# Altium footprint library Tienanh.PcbLib: 190 footprints (part 11 of 12)
Each footprint in its own frame and in the unit in brackets; x right, y up, seen from the top. Pads: shape width x height; smd on the part's side, far side on the other; paste and mask are expansions set on the pad; w line width, h text height; cw(c..) or ccw(c..) is an arc to the next point about the centre after c.
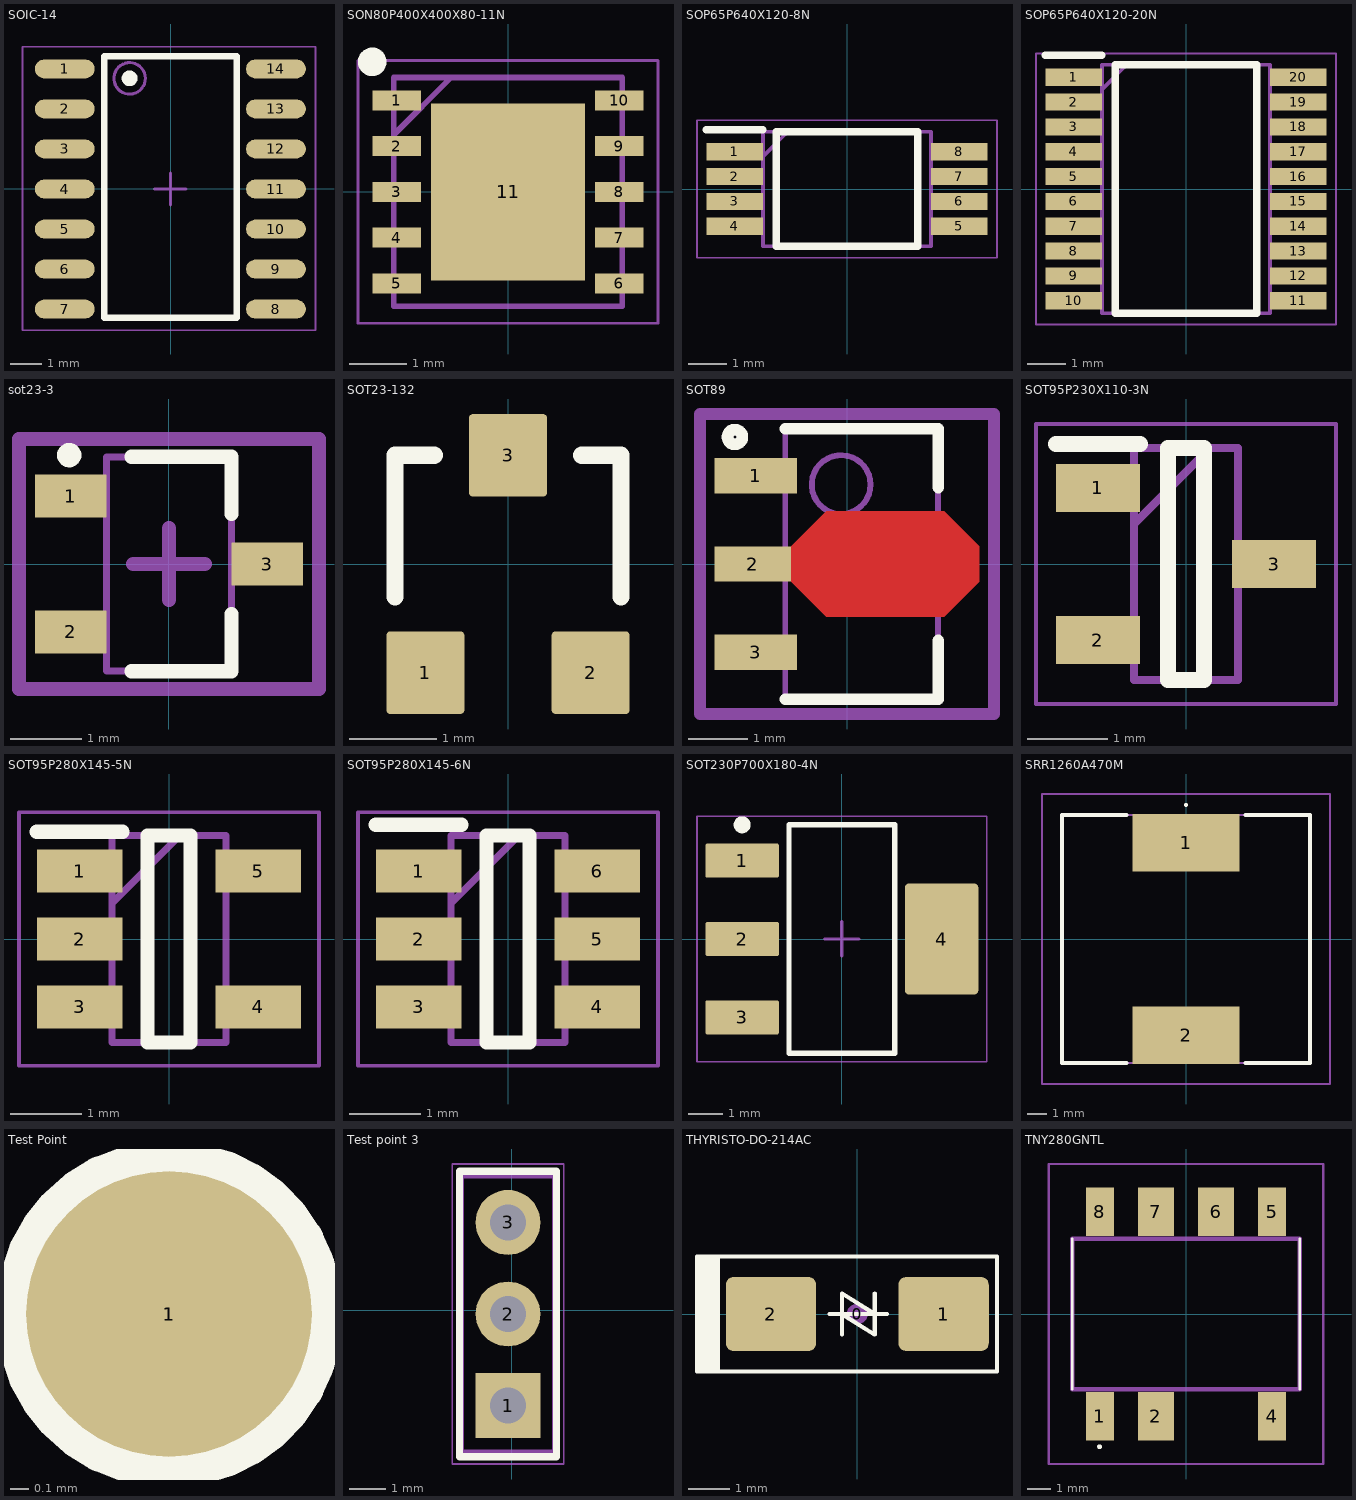
[diagram p10: the footprints below, top view; thin cyan lines are the x and y axes]

## SOIC-14 [mm]
pads (14):
  oval 1.9x0.6 smd mask+0.07: 1(-3.357,3.799) 2(-3.357,2.529) 3(-3.357,1.259) 4(-3.357,-0.011) 5(-3.357,-1.281) 6(-3.357,-2.551) 7(-3.357,-3.821) 8(3.343,-3.821) 9(3.343,-2.551) 10(3.343,-1.281) 11(3.343,-0.011) 12(3.343,1.259) 13(3.343,2.529) 14(3.343,3.799)
Top Overlay:
  circle w0.25: c-1.3,3.5 r0.125
  lines w0.2: -2.1,-4.1 2.1,-4.1 2.1,4.2 -2.1,4.2 -2.1,-4.1
Mechanical 13:
  circle w0.1: c-1.3,3.5 r0.5
Mechanical 15:
  lines w0.05: -4.7,-4.5 4.6,-4.5 4.6,4.5 -4.7,4.5 -4.7,-4.5
  lines w0.1: -0.507,-0.011 0.493,-0.011 ; -0.007,-0.511 -0.007,0.489
3D body "D14-M.stp": height 1.76, standoff 0, extent -3.106,-4.38 3.092,4.358

## SON80P400X400X80-11N [mm]
pads (11):
  rect 0.85x0.35 smd: 1(-1.95,1.6) 2(-1.95,0.8) 3(-1.95,0) 4(-1.95,-0.8) 5(-1.95,-1.6) 6(1.95,-1.6) 7(1.95,-0.8) 8(1.95,0) 9(1.95,0.8) 10(1.95,1.6)
  rect 2.7x3.1 smd: 11(0,0)
Top Overlay:
  circle w0.25: c-2.375,2.275 r0.125
Mechanical 13:
  lines w0.1: -2,1 -1,2 ; -2,-2 2,-2 2,2 -2,2 -2,-2
Mechanical 15:
  lines w0.05: -2.625,-2.3 2.625,-2.3 2.625,2.3 -2.625,2.3 -2.625,-2.3
3D body "LM5113SDX_NOPB.stp": height 0.8, standoff 0, extent -2,-2 2,2

## SOP65P640X120-8N [mm]
pads (8):
  rect 1.475x0.45 smd: 1(-2.938,0.975) 2(-2.938,0.325) 3(-2.938,-0.325) 4(-2.938,-0.975) 5(2.938,-0.975) 6(2.938,-0.325) 7(2.938,0.325) 8(2.938,0.975)
Top Overlay:
  lines w0.2: -3.675,1.55 -2.2,1.55 ; -1.85,-1.5 -1.85,1.5 1.85,1.5 1.85,-1.5 -1.85,-1.5
Mechanical 13:
  lines w0.1: -2.2,0.85 -1.55,1.5 ; -2.2,-1.5 -2.2,1.5 2.2,1.5 2.2,-1.5 -2.2,-1.5
Mechanical 15:
  lines w0.05: -3.925,-1.8 -3.925,1.8 3.925,1.8 3.925,-1.8 -3.925,-1.8
3D body "INA240A2PW.stp": height 1.11, standoff 0.01, extent -3.21,-1.5 3.21,1.5

## SOP65P640X120-20N [mm]
pads (20):
  rect 1.475x0.45 smd: 1(-2.938,2.925) 2(-2.938,2.275) 3(-2.938,1.625) 4(-2.938,0.975) 5(-2.938,0.325) 6(-2.938,-0.325) 7(-2.938,-0.975) 8(-2.938,-1.625) 9(-2.938,-2.275) 10(-2.938,-2.925) 11(2.938,-2.925) 12(2.938,-2.275) 13(2.938,-1.625) 14(2.938,-0.975) 15(2.938,-0.325) 16(2.938,0.325) 17(2.938,0.975) 18(2.938,1.625) 19(2.938,2.275) 20(2.938,2.925)
Top Overlay:
  lines w0.2: -3.675,3.5 -2.2,3.5 ; -1.85,-3.25 1.85,-3.25 1.85,3.25 -1.85,3.25 -1.85,-3.25
Mechanical 13:
  lines w0.1: -2.2,2.6 -1.55,3.25 ; -2.2,-3.25 2.2,-3.25 2.2,3.25 -2.2,3.25 -2.2,-3.25
Mechanical 15:
  lines w0.05: -3.925,-3.55 3.925,-3.55 3.925,3.55 -3.925,3.55 -3.925,-3.55
3D body "UCC28070APW.stp": height 1.13, standoff 0, extent -3.2,-3.25 3.2,3.25

## sot23-3 [mm]
pads (3):
  rect 1x0.6 smd: 1(-1.375,0.95) 2(-1.375,-0.95) 3(1.375,0)
Top Overlay:
  circle w0.2: c-1.397,1.524 r0.07
  lines w0.2: -0.525,-1.5 0.875,-1.5 0.875,-0.7 ; -0.525,1.5 0.875,1.5 0.875,0.7
Mechanical 13:
  lines w0.1: -0.875,-1.5 -0.875,1.5 0.875,1.5 0.875,-1.5 -0.875,-1.5
Mechanical 15:
  lines w0.2: -0.5,0 0.5,0 ; 0,-0.5 0,0.5 ; -2.1,-1.75 -2.1,1.75 2.1,1.75 2.1,-1.75 -2.1,-1.75
3D body "SW3DPS-SOT-23-DEFAULT.STEP": height 1.06, standoff -0.04, extent -1.25,-1.5 1.25,1.5

## SOT23-132 [mm]
pads (3):
  rrect10% 0.9x0.95 smd mask+0.07: 1(-0.95,-1.25) 2(0.95,-1.25) 3(0,1.25)
Top Overlay:
  lines w0.2: -1.3,-0.375 -1.3,1.25 -0.85,1.25 ; 0.85,1.25 1.3,1.25 1.3,-0.375
Mechanical 7:
3D body "SW3DPS-SOT-23-DEFAULT.STEP": height 1.06, standoff -0.04, extent -1.5,-1.25 1.5,1.25

## SOT89 [mm]
pads (3):
  rect 1.4x0.6 smd: 1(-1.55,1.5) 3(-1.55,-1.5)
  rect 1.3x0.6 smd: 2(-1.6,0)
Top Layer:
  region: -0.95,0.3 -0.35,0.9 1.65,0.9 2.25,0.3 2.25,-0.3 1.65,-0.9 -0.35,-0.9 -0.95,-0.3
Top Overlay:
  circle w0.2: c-1.905,2.159 r0.125
  lines w0.2: -1.05,-2.3 1.55,-2.3 1.55,-1.3 ; -1.05,2.3 1.55,2.3 1.55,1.3
Mechanical 13:
  circle w0.1: c-0.1,1.35 r0.5
  lines w0.1: -1.05,-2.3 -1.05,2.3 1.55,2.3 1.55,-2.3 -1.05,-2.3
Mechanical 15:
  lines w0.2: -2.5,-2.55 -2.5,2.55 2.5,2.55 2.5,-2.55 -2.5,-2.55
3D body "CircuitWorks-SOT89.step": height 1.5, standoff 0, extent -2.1,-2.25 1.9,2.25

## SOT95P230X110-3N [mm]
pads (3):
  rect 1.05x0.6 smd: 1(-1.1,0.95) 2(-1.1,-0.95) 3(1.1,0)
Top Overlay:
  lines w0.2: -1.625,1.5 -0.575,1.5 ; -0.225,-1.45 -0.225,1.45 0.225,1.45 0.225,-1.45 -0.225,-1.45
Mechanical 13:
  lines w0.1: -0.65,0.5 0.3,1.45 ; -0.65,-1.45 -0.65,1.45 0.65,1.45 0.65,-1.45 -0.65,-1.45
Mechanical 15:
  lines w0.05: -1.875,-1.75 -1.875,1.75 1.875,1.75 1.875,-1.75 -1.875,-1.75
3D body "TL431MFDT,215.stp": height 0.95, standoff 0, extent -1.201,-1.448 1.199,1.452

## SOT95P280X145-5N [mm]
pads (5):
  rect 1.2x0.6 smd: 1(-1.25,0.95) 2(-1.25,0) 3(-1.25,-0.95) 4(1.25,-0.95) 5(1.25,0.95)
Top Overlay:
  lines w0.2: -1.85,1.5 -0.65,1.5 ; -0.3,-1.45 -0.3,1.45 0.3,1.45 0.3,-1.45 -0.3,-1.45
Mechanical 13:
  lines w0.1: -0.8,0.5 0.15,1.45 ; -0.8,-1.45 -0.8,1.45 0.8,1.45 0.8,-1.45 -0.8,-1.45
Mechanical 15:
  lines w0.05: -2.1,-1.775 -2.1,1.775 2.1,1.775 2.1,-1.775 -2.1,-1.775
3D body "LM4128AMF-3.0_NOPB.stp": height 1.2, standoff 0, extent -1.4,-1.45 1.4,1.45

## SOT95P280X145-6N [mm]
pads (6):
  rect 1.2x0.6 smd: 1(-1.25,0.95) 2(-1.25,0) 3(-1.25,-0.95) 4(1.25,-0.95) 5(1.25,0) 6(1.25,0.95)
Top Overlay:
  lines w0.2: -1.85,1.6 -0.65,1.6 ; -0.3,-1.45 -0.3,1.45 0.3,1.45 0.3,-1.45 -0.3,-1.45
Mechanical 13:
  lines w0.1: -0.8,0.5 0.15,1.45 ; -0.8,-1.45 -0.8,1.45 0.8,1.45 0.8,-1.45 -0.8,-1.45
Mechanical 15:
  lines w0.05: -2.1,-1.775 -2.1,1.775 2.1,1.775 2.1,-1.775 -2.1,-1.775
3D body "TLV61048DBVT.stp": height 1.2, standoff 0, extent -1.4,-1.45 1.4,1.45

## SOT230P700X180-4N [mm]
pads (4):
  rrect10% 2.15x1 smd mask+0.07: 1(-2.925,2.3) 2(-2.925,0) 3(-2.925,-2.3)
  rrect10% 2.15x3.25 smd mask+0.07: 4(2.925,0)
Top Overlay:
  circle w0.25: c-2.925,3.35 r0.125
  lines w0.15: -1.55,-3.35 -1.55,3.35 1.55,3.35 1.55,-3.35 -1.55,-3.35
Mechanical 15:
  lines w0.05: -4.25,-3.6 -4.25,3.6 4.25,3.6 4.25,-3.6 -4.25,-3.6
  lines w0.1: -0.5,0 0.5,0 ; 0,-0.5 0,0.5
3D body "SOT230P700X180-4N.step": height 1.8, standoff 0, extent -3.5,-3.35 3.5,3.35

## SRR1260A470M [mm]
pads (2):
  rect 5.4x2.9 smd: 1(0,4.85) 2(0,-4.85)
Top Overlay:
  lines w0.1: 0,6.7 cw(c0,6.75) 0,6.8 cw(c0,6.75) 0,6.7
  lines w0.2: -3,-6.25 -6.25,-6.25 -6.25,6.25 -3,6.25 ; 3,-6.25 6.25,-6.25 6.25,6.25 3,6.25
Mechanical 13:
  lines w0.1: -6.25,-6.25 6.25,-6.25 6.25,6.25 -6.25,6.25 -6.25,-6.25
Mechanical 15:
  lines w0.1: -7.25,-7.3 7.25,-7.3 7.25,7.3 -7.25,7.3 -7.25,-7.3
3D body "SRR1260A-470M.stp": height 6.25, standoff 0, extent -6.25,-6.25 6.25,6.25

## Test Point [mil]
pads (2):
  round 60 smd: 1(0,0)
  round 60 on Top Solder: 1(0,0)
Top Overlay:
  circle w10: c0,0 r31.5

## Test point 3 [mm]
pads (3):
  rect 1.8x1.8 hole 1 mask+0.075: 1(-0.1,-2.64)
  round 1.8 hole 1 mask+0.075: 2(-0.1,-0.1) 3(-0.1,2.44)
Top Overlay:
  lines w0.2: -1.445,-4.06 -1.445,3.86 1.245,3.86 1.245,-4.06 -1.445,-4.06
Top Assembly:
  lines w0.1: -1.37,-3.91 -1.37,3.71 1.17,3.71 1.17,-3.91 -1.37,-3.91
  text ".Designator" at 0.257,-3.747 h1
Top Courtyard:
  lines w0.05: -0.6,-0.1 0.4,-0.1 ; -0.1,-0.6 -0.1,0.4 ; -1.645,-4.26 -1.645,4.06 1.445,4.06 1.445,-4.26 -1.645,-4.26
Top Value:
  text ".Value" at 0.4,-1.904 h1
3D body "Test Point Keystone - 5000 RED.STEP": height 4.57, standoff -3.05, extent -1.37,1.17 1.17,3.71
3D body "Test Point Keystone - 5000 RED.STEP": height 4.57, standoff -3.05, extent -1.37,-3.91 1.17,-1.37
3D body "Test Point Keystone - 5000 RED.STEP": height 4.57, standoff -3.05, extent -1.37,-1.37 1.17,1.17

## THYRISTO-DO-214AC [mm]
pads (3):
  round 0.508 on Mech14: 0(0,0)
  rrect20% 2.2x1.8 smd mask+0.07: 1(2.1,0) 2(-2.1,0)
Top Overlay:
  region: -3.387,1.4 -3.9,1.4 -3.9,-1.4 -3.387,-1.4
  lines w0.1: -0.675,0 -0.375,0 ; -0.375,-0.5 -0.375,0 ; 0.425,0.5 0.425,-0.5 -0.375,0 ; 0.725,0 0.425,0 ; -0.375,0 0.425,0 ; -0.375,0 -0.375,0.5 0.425,0 ; -3.9,-1.4 -3.387,-1.4 -3.387,1.4 -3.9,1.4 -3.9,-1.4 ; -3.4,-1.4 3.4,-1.4 3.4,1.4 -3.4,1.4 -3.4,-1.4
3D body "SW3dPS-DO-214AC SMA.STEP": height 2.42, standoff 0.02, extent -2.525,-1.375 2.675,1.225

## TNY280GNTL [mil]
pads (7):
  rect 45.98x80 smd: 1(-142.99,-170) 4(142.99,-170) 5(142.99,170) 8(-142.99,170)
  rect 60x80 smd: 2(-50,-170) 6(50,170) 7(-50,170)
Top Overlay:
  lines w3.94: -188.98,-125 -188.98,125 ; 188.98,-125 188.98,125 ; -145.67,-220.47 cw(c-143.7,-220.47) -141.73,-220.47 cw(c-143.7,-220.47) -145.67,-220.47
Mechanical 13:
  lines w7.87: -188.98,-125 188.98,-125 188.98,125 -188.98,125 -188.98,-125
Mechanical 15:
  lines w3.94: -228.35,-249.37 228.35,-249.37 228.35,249.37 -228.35,249.37 -228.35,-249.37